# Altium footprint library PCB SMD.PcbLib: 79 footprints (part 1 of 5)
Each footprint in its own frame and in the unit in brackets; x right, y up, seen from the top. Pads: shape width x height; smd on the part's side, far side on the other; paste and mask are expansions set on the pad; w line width, h text height; cw(c..) or ccw(c..) is an arc to the next point about the centre after c.
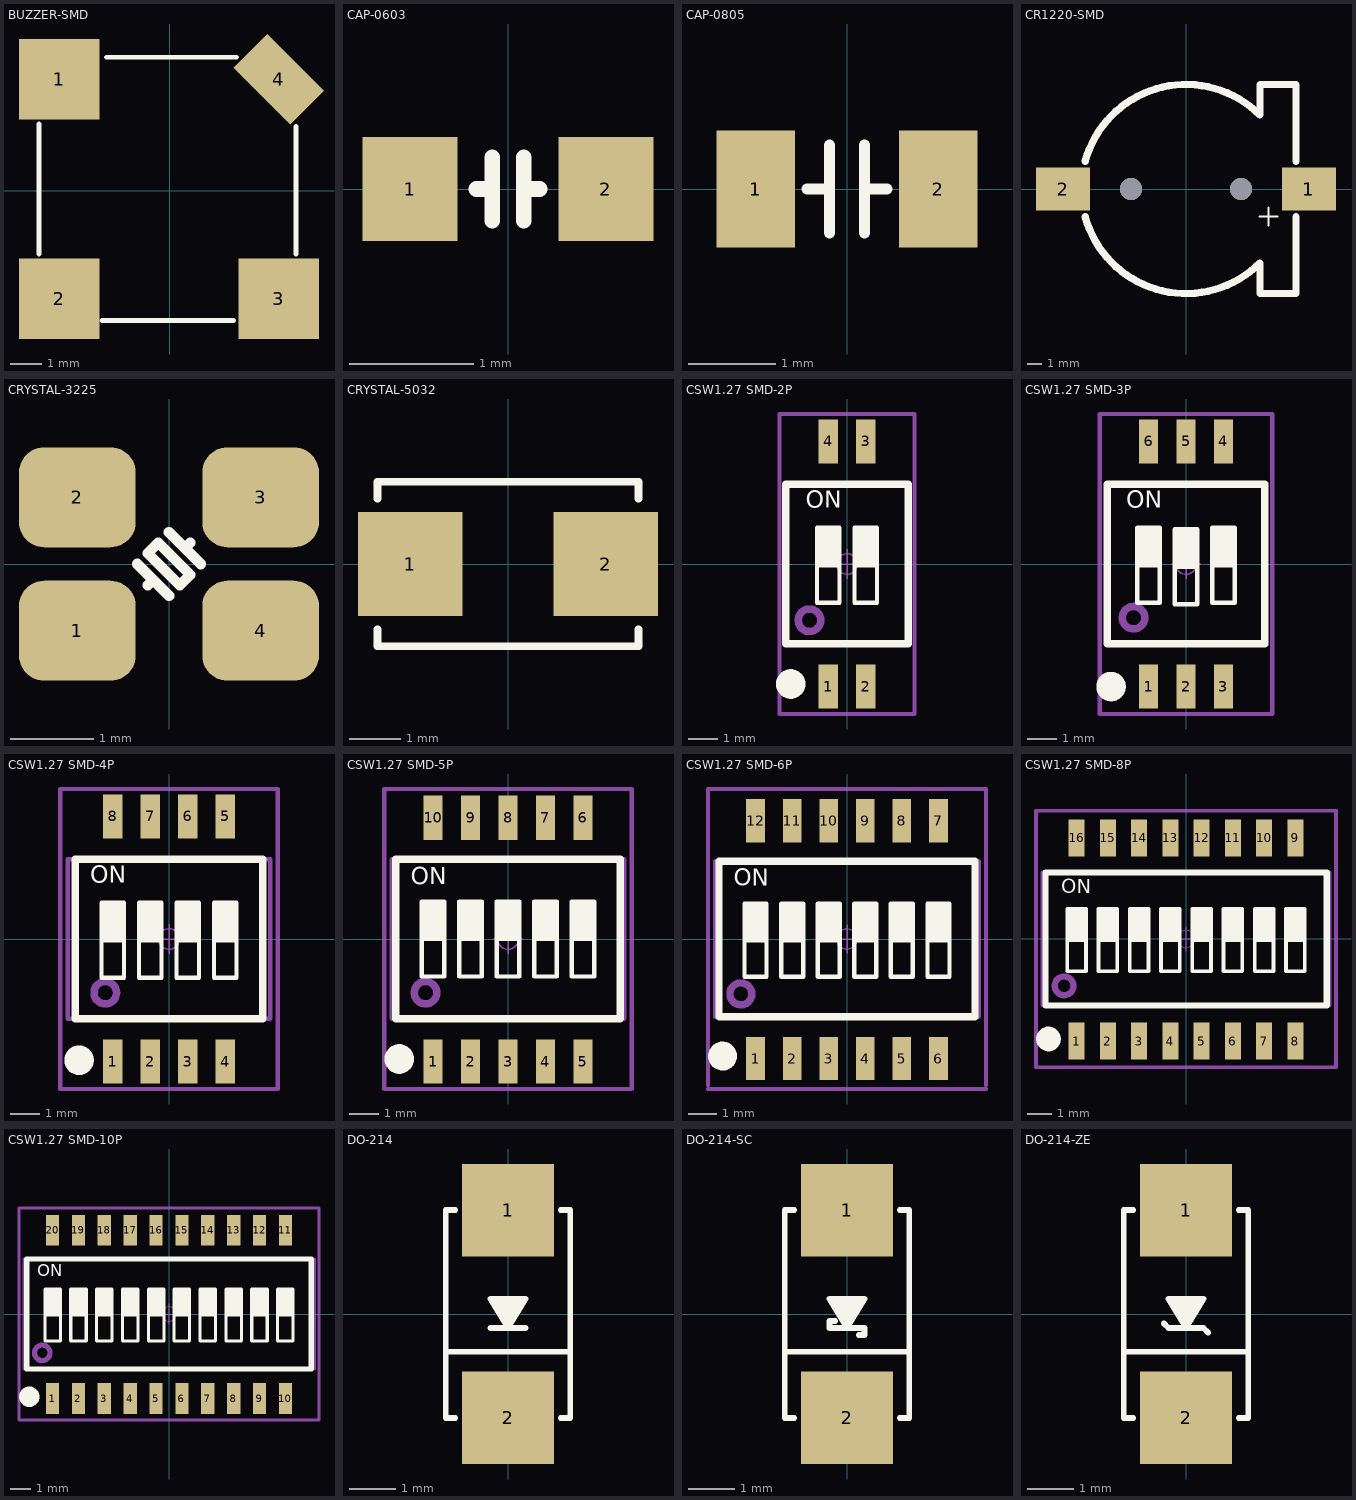
[diagram p0: the footprints below, top view; thin cyan lines are the x and y axes]

## BUZZER-SMD [mil]
pads (4):
  rect 100x100 smd: 1(-137.81,138.81) 2(-137.81,-134.81) 3(135.81,-134.81)
  rect 60x100 smd rot 45: 4(135.81,138.81)
Top Overlay:
  lines w6: -162.81,-78.81 -162.81,83.19 ; -84.81,-161.81 79.19,-161.81 ; -78.81,166.19 83.19,166.19 ; 157,-79 157,80
3D body "User Library-HCS09G.STEP": height 141.73, standoff 0, extent -172.32,-167.32 162.33,167.33

## CAP-0603 [mil]
pads (2):
  rect 30x33 smd: 1(-31,0) 2(31,0)
Top Overlay:
  lines w5: -10,0 -5,0 ; -5,-10 -5,10 ; 5,-10 5,10 ; 5,0 10,0
3D body "SW3dPS-0603 SMD Capacitor.STEP": height 12.39, standoff 0.5, extent -31.5,-15.75 31.5,15.75

## CAP-0805 [mm]
pads (2):
  rect 0.9x1.35 smd: 1(-1.05,0) 2(1.05,0)
Top Overlay:
  lines w0.127: -0.457,0 -0.203,0 ; -0.203,-0.508 -0.203,0.508 ; 0.203,-0.508 0.203,0.508 ; 0.203,0 0.457,0
3D body "User Library-CAPC2012X___.STEP": height 0.57, standoff 0, extent -1,-0.635 1,0.635

## CR1220-SMD [mm]
pads (2):
  rect 3.75x3 smd: 1(8.509,0) 2(-8.509,0)
via -3.81,0 diameter 1.5 hole 1.5
via 3.81,0 diameter 1.5 hole 1.5
Top Overlay:
  lines w0.127: 5.08,-1.905 6.35,-1.905 ; 5.715,-2.54 5.715,-1.27
  lines w0.508: -6.984,-1.905 ccw(c0,0) 5.119,-5.119 5.119,-7.239 7.62,-7.239 7.62,-1.905 ; -6.984,1.905 cw(c0,0) 5.119,5.119 5.119,7.239 7.62,7.239 7.62,1.905
3D body "User Library-Battery Holder for CR1220 SMD.STEP": height 4.26, standoff -0.49, extent -9.273,-7.366 9.527,7.383

## CRYSTAL-3225 [mm]
pads (4):
  rrect50% 1.4x1.2 smd: 1(-1.1,-0.8) 2(-1.1,0.8) 3(1.1,0.8) 4(1.1,-0.8)
Top Overlay:
  lines w0.127: -0.381,0 0,-0.381 ; -0.254,-0.254 -0.191,-0.191 ; 0,0.381 0.381,0 ; 0.191,0.191 0.254,0.254 ; -0.254,0.127 0.127,-0.254 0.254,-0.127 -0.127,0.254 -0.254,0.127
3D body "User Library-CTS.step": height 0.77, standoff 0, extent -1.6,-1.25 1.6,1.25

## CRYSTAL-5032 [mil]
pads (2):
  rect 80x80 smd: 1(-75,0) 2(75,0)
Top Overlay:
  lines w5.91: -100,-50 -100,-62.99 -98.43,-62.99 98.43,-62.99 100,-62.99 100,-50 ; -100,50 -100,62.99 -98.43,62.99 98.43,62.99 100,62.99 100,50
3D body "User Library-ABM3-1.STEP": height 51.18, standoff 0, extent -98.42,-62.99 98.43,63

## CSW1.27 SMD-2P [mm]
pads (4):
  rect 0.65x1.5 smd: 1(-0.635,-4.15) 2(0.635,-4.15) 3(0.635,4.15) 4(-0.635,4.15)
Top Overlay:
  circle w0.5: c-1.905,-4.064 r0.25
  region: 1.016,1.225 0.254,1.225 0.254,-0.045 1.016,-0.045
  region: -0.254,1.225 -1.016,1.225 -1.016,-0.045 -0.254,-0.045
  lines w0.15: -1.016,-0.045 -0.254,-0.045 ; 0.254,-0.045 1.016,-0.045 ; -1.016,-1.315 -1.016,1.225 -0.254,1.225 -0.254,-1.315 -1.016,-1.315 ; 0.254,-1.315 0.254,1.225 1.016,1.225 1.016,-1.315 0.254,-1.315
  lines w0.254: -2.07,-2.7 2.07,-2.7 2.07,2.7 -2.07,2.7 -2.07,-2.7
  text "ON" at -1.397,1.696 h1
Mechanical 13:
  circle w0.254: c-1.27,-1.905 r0.381
  lines w0.15: -2.032,-2.7 -2.032,2.7 2.032,2.7 2.032,-2.7 -2.032,-2.7
Mechanical 15:
  circle w0.05: c0,0 r0.35
  lines w0.05: -0.5,0 0.5,0 ; 0,-0.5 0,0.5
  lines w0.15: -2.286,-5.08 -2.286,5.08 2.286,5.08 2.286,-5.08 2.159,-5.08 -2.286,-5.08
3D body "CSW1.27-SMD-2P.STEP": height 2.35, standoff 0, extent -2.07,-4.35 2.07,4.35

## CSW1.27 SMD-3P [mm]
pads (6):
  rect 0.65x1.5 smd: 1(-1.27,-4.15) 2(0,-4.15) 3(1.27,-4.15) 4(1.27,4.15) 5(0,4.15) 6(-1.27,4.15)
Top Overlay:
  circle w0.5: c-2.54,-4.15 r0.25
  region: -0.889,1.225 -1.651,1.225 -1.651,-0.045 -0.889,-0.045
  region: 0.381,1.184 -0.381,1.184 -0.381,-0.086 0.381,-0.086
  region: 1.651,1.225 0.889,1.225 0.889,-0.045 1.651,-0.045
  lines w0.15: -1.651,-0.045 -0.889,-0.045 ; -0.381,-0.086 0.381,-0.086 ; 0.889,-0.045 1.651,-0.045 ; -1.651,-1.315 -0.889,-1.315 -0.889,1.225 -1.651,1.225 -1.651,-1.315 ; -0.381,-1.356 0.381,-1.356 0.381,1.184 -0.381,1.184 -0.381,-1.356 ; 0.889,-1.315 1.651,-1.315 1.651,1.225 0.889,1.225 0.889,-1.315
  lines w0.254: -2.667,-2.7 -2.667,2.7 2.667,2.7 2.667,-2.7 -2.667,-2.7
  text "ON" at -2.032,1.696 h1
Mechanical 13:
  circle w0.254: c-1.778,-1.819 r0.381
  lines w0.15: -2.667,-2.7 2.705,-2.7 2.705,2.7 -2.667,2.7 -2.667,-2.7
Mechanical 15:
  circle w0.05: c0,0 r0.35
  lines w0.05: -0.5,0 0.5,0 ; 0,-0.5 0,0.5
  lines w0.15: -2.921,-5.08 2.159,-5.08 2.921,-5.08 2.921,5.08 -2.921,5.08 -2.921,-5.08
3D body "CSW1.27-SMD-3P.STEP": height 2.35, standoff 0, extent -2.705,-4.35 2.705,4.35

## CSW1.27 SMD-4P [mm]
pads (8):
  rect 0.65x1.5 smd: 1(-1.905,-4.15) 2(-0.635,-4.15) 3(0.635,-4.15) 4(1.905,-4.15) 5(1.905,4.15) 6(0.635,4.15) 7(-0.635,4.15) 8(-1.905,4.15)
Top Overlay:
  circle w0.5: c-3.048,-4.105 r0.25
  region: -1.524,1.225 -2.286,1.225 -2.286,-0.045 -1.524,-0.045
  region: -0.254,1.225 -1.016,1.225 -1.016,-0.045 -0.254,-0.045
  region: 1.016,1.225 0.254,1.225 0.254,-0.045 1.016,-0.045
  region: 2.286,1.225 1.524,1.225 1.524,-0.045 2.286,-0.045
  lines w0.15: -2.286,-0.045 -1.524,-0.045 ; -1.016,-0.045 -0.254,-0.045 ; 0.254,-0.045 1.016,-0.045 ; 1.524,-0.045 2.286,-0.045 ; -2.286,-1.315 -1.524,-1.315 -1.524,1.225 -2.286,1.225 -2.286,-1.315 ; -1.016,-1.315 -0.254,-1.315 -0.254,1.225 -1.016,1.225 -1.016,-1.315 ; 0.254,-1.315 1.016,-1.315 1.016,1.225 0.254,1.225 0.254,-1.315 ; 1.524,-1.315 2.286,-1.315 2.286,1.225 1.524,1.225 1.524,-1.315
  lines w0.254: -3.175,-2.7 -3.175,2.7 3.175,2.7 3.175,-2.7 -3.175,-2.7
  text "ON" at -2.667,1.696 h1
Mechanical 13:
  circle w0.254: c-2.159,-1.819 r0.381
  lines w0.15: -3.429,-2.7 3.429,-2.7 3.429,2.7 -3.429,2.7 -3.429,-2.7
Mechanical 15:
  circle w0.05: c0,0 r0.35
  lines w0.05: -0.5,0 0.5,0 ; 0,-0.5 0,0.5
  lines w0.15: -3.683,-5.08 2.159,-5.08 3.683,-5.08 3.683,5.08 -3.683,5.08 -3.683,-5.08
3D body "CSW1.27-SMD-4P.STEP": height 2.35, standoff 0, extent -3.34,-4.35 3.34,4.35

## CSW1.27 SMD-5P [mm]
pads (10):
  rect 0.65x1.5 smd: 1(-2.54,-4.15) 2(-1.27,-4.15) 3(0,-4.15) 4(1.27,-4.15) 5(2.54,-4.15) 6(2.54,4.105) 7(1.27,4.105) 8(0,4.105) 9(-1.27,4.105) 10(-2.54,4.105)
Top Overlay:
  circle w0.5: c-3.683,-4.064 r0.25
  region: 0.381,1.27 -0.381,1.27 -0.381,0 0.381,0
  region: 2.921,1.27 2.159,1.27 2.159,0 2.921,0
  region: 1.651,1.27 0.889,1.27 0.889,0 1.651,0
  region: -0.889,1.27 -1.651,1.27 -1.651,0 -0.889,0
  region: -2.159,1.27 -2.921,1.27 -2.921,0 -2.159,0
  lines w0.15: -2.921,0 -2.159,0 ; -1.651,0 -0.889,0 ; -0.381,0 0.381,0 ; 0.889,0 1.651,0 ; 2.159,0 2.921,0 ; -2.921,-1.27 -2.921,1.27 -2.159,1.27 -2.159,-1.27 -2.921,-1.27 ; -1.651,-1.27 -1.651,1.27 -0.889,1.27 -0.889,-1.27 -1.651,-1.27 ; -0.381,-1.27 0.381,-1.27 0.381,1.27 -0.381,1.27 -0.381,-1.27 ; 0.889,-1.27 0.889,1.27 1.651,1.27 1.651,-1.27 0.889,-1.27 ; 2.159,-1.27 2.159,1.27 2.921,1.27 2.921,-1.27 2.159,-1.27
  lines w0.254: -3.81,-2.7 3.81,-2.7 3.81,2.7 -3.81,2.7 -3.81,-2.7
  text "ON" at -3.302,1.651 h1
Mechanical 13:
  circle w0.254: c-2.794,-1.819 r0.381
  lines w0.15: -3.937,-2.7 -3.937,2.7 3.937,2.7 3.937,-2.7 -3.937,-2.7
Mechanical 15:
  circle w0.05: c0,0 r0.35
  lines w0.05: -0.5,0 0.5,0 ; 0,-0.5 0,0.5
  lines w0.15: -4.191,-5.08 -4.191,5.08 4.191,5.08 4.191,-5.08 2.159,-5.08 -4.191,-5.08
3D body "CSW1.27-SMD-5P.STEP": height 2.35, standoff 0, extent -3.975,-4.35 3.975,4.35

## CSW1.27 SMD-6P [mm]
pads (12):
  rect 0.65x1.5 smd: 1(-3.175,-4.15) 2(-1.905,-4.15) 3(-0.635,-4.15) 4(0.635,-4.15) 5(1.905,-4.15) 6(3.175,-4.15) 7(3.175,4.105) 8(1.905,4.105) 9(0.635,4.105) 10(-0.635,4.105) 11(-1.905,4.105) 12(-3.175,4.105)
Top Overlay:
  circle w0.5: c-4.318,-4.064 r0.25
  region: 3.556,1.225 2.794,1.225 2.794,-0.045 3.556,-0.045
  region: 2.286,1.225 1.524,1.225 1.524,-0.045 2.286,-0.045
  region: 1.016,1.225 0.254,1.225 0.254,-0.045 1.016,-0.045
  region: -0.254,1.225 -1.016,1.225 -1.016,-0.045 -0.254,-0.045
  region: -1.524,1.225 -2.286,1.225 -2.286,-0.045 -1.524,-0.045
  region: -2.794,1.225 -3.556,1.225 -3.556,-0.045 -2.794,-0.045
  lines w0.15: -3.556,-0.045 -2.794,-0.045 ; -2.286,-0.045 -1.524,-0.045 ; -1.016,-0.045 -0.254,-0.045 ; 0.254,-0.045 1.016,-0.045 ; 1.524,-0.045 2.286,-0.045 ; 2.794,-0.045 3.556,-0.045 ; -3.556,-1.315 -3.556,1.225 -2.794,1.225 -2.794,-1.315 -3.556,-1.315 ; -2.286,-1.315 -2.286,1.225 -1.524,1.225 -1.524,-1.315 -2.286,-1.315 ; -1.016,-1.315 -1.016,1.225 -0.254,1.225 -0.254,-1.315 -1.016,-1.315 ; 0.254,-1.315 0.254,1.225 1.016,1.225 1.016,-1.315 0.254,-1.315 ; 1.524,-1.315 1.524,1.225 2.286,1.225 2.286,-1.315 1.524,-1.315 ; 2.794,-1.315 2.794,1.225 3.556,1.225 3.556,-1.315 2.794,-1.315
  lines w0.254: -4.445,-2.7 4.445,-2.7 4.445,2.7 -4.445,2.7 -4.445,-2.7
  text "ON" at -3.937,1.651 h1
Mechanical 13:
  circle w0.254: c-3.683,-1.905 r0.381
  lines w0.15: -4.572,-2.7 -4.572,2.7 4.572,2.7 4.572,-2.7 -4.572,-2.7
Mechanical 15:
  circle w0.05: c0,0 r0.35
  lines w0.05: -0.5,0 0.5,0 ; 0,-0.5 0,0.5
  lines w0.15: -4.826,-5.207 2.159,-5.207 4.826,-5.207 ; -4.826,-5.08 -4.826,5.207 4.826,5.207 4.826,-5.08
3D body "CSW1.27-SMD-6P.STEP": height 2.35, standoff 0, extent -4.61,-4.35 4.61,4.35

## CSW1.27 SMD-8P [mm]
pads (16):
  rect 0.65x1.5 smd: 1(-4.445,-4.15) 2(-3.175,-4.15) 3(-1.905,-4.15) 4(-0.635,-4.15) 5(0.635,-4.15) 6(1.905,-4.15) 7(3.175,-4.15) 8(4.445,-4.15) 9(4.445,4.105) 10(3.175,4.105) 11(1.905,4.105) 12(0.635,4.105) 13(-0.635,4.105) 14(-1.905,4.105) 15(-3.175,4.105) 16(-4.445,4.105)
Top Overlay:
  circle w0.5: c-5.588,-4.064 r0.25
  region: -4.064,1.225 -4.826,1.225 -4.826,-0.045 -4.064,-0.045
  region: -2.794,1.225 -3.556,1.225 -3.556,-0.045 -2.794,-0.045
  region: -1.524,1.225 -2.286,1.225 -2.286,-0.045 -1.524,-0.045
  region: -0.254,1.225 -1.016,1.225 -1.016,-0.045 -0.254,-0.045
  region: 1.016,1.225 0.254,1.225 0.254,-0.045 1.016,-0.045
  region: 2.286,1.225 1.524,1.225 1.524,-0.045 2.286,-0.045
  region: 3.556,1.225 2.794,1.225 2.794,-0.045 3.556,-0.045
  region: 4.826,1.225 4.064,1.225 4.064,-0.045 4.826,-0.045
  lines w0.15: -4.826,-0.045 -4.064,-0.045 ; -3.556,-0.045 -2.794,-0.045 ; -2.286,-0.045 -1.524,-0.045 ; -1.016,-0.045 -0.254,-0.045 ; 0.254,-0.045 1.016,-0.045 ; 1.524,-0.045 2.286,-0.045 ; 2.794,-0.045 3.556,-0.045 ; 4.064,-0.045 4.826,-0.045 ; -4.826,-1.315 -4.064,-1.315 -4.064,1.225 -4.826,1.225 -4.826,-1.315 ; -3.556,-1.315 -2.794,-1.315 -2.794,1.225 -3.556,1.225 -3.556,-1.315 ; -2.286,-1.315 -1.524,-1.315 -1.524,1.225 -2.286,1.225 -2.286,-1.315 ; -1.016,-1.315 -0.254,-1.315 -0.254,1.225 -1.016,1.225 -1.016,-1.315 ; 0.254,-1.315 1.016,-1.315 1.016,1.225 0.254,1.225 0.254,-1.315 ; 1.524,-1.315 2.286,-1.315 2.286,1.225 1.524,1.225 1.524,-1.315 ; 2.794,-1.315 3.556,-1.315 3.556,1.225 2.794,1.225 2.794,-1.315 ; 4.064,-1.315 4.826,-1.315 4.826,1.225 4.064,1.225 4.064,-1.315
  lines w0.254: -5.715,-2.7 -5.715,2.7 5.715,2.7 5.715,-2.7 -5.715,-2.7
  text "ON" at -5.08,1.651 h1
Mechanical 13:
  circle w0.254: c-4.953,-1.905 r0.381
  lines w0.15: -5.842,-2.7 5.842,-2.7 5.842,2.7 -5.842,2.7 -5.842,-2.7
Mechanical 15:
  circle w0.05: c0,0 r0.35
  lines w0.05: -0.5,0 0.5,0 ; 0,-0.5 0,0.5
  lines w0.15: 6.095,-5.21 -6.096,-5.21 -6.096,-5.207 -6.096,5.207 6.096,5.207 6.096,-5.21
3D body "CSW1.27-SMD-8P.STEP": height 2.35, standoff 0, extent -5.88,-4.35 5.88,4.35

## CSW1.27 SMD-10P [mm]
pads (20):
  rect 0.65x1.5 smd: 1(-5.715,-4.15) 2(-4.445,-4.15) 3(-3.175,-4.15) 4(-1.905,-4.15) 5(-0.635,-4.15) 6(0.635,-4.15) 7(1.905,-4.15) 8(3.175,-4.15) 9(4.445,-4.15) 10(5.715,-4.15) 11(5.715,4.105) 12(4.445,4.105) 13(3.175,4.105) 14(1.905,4.105) 15(0.635,4.105) 16(-0.635,4.105) 17(-1.905,4.105) 18(-3.175,4.105) 19(-4.445,4.105) 20(-5.715,4.105)
Top Overlay:
  circle w0.5: c-6.858,-4.064 r0.25
  region: -5.334,1.225 -6.096,1.225 -6.096,-0.045 -5.334,-0.045
  region: -4.064,1.225 -4.826,1.225 -4.826,-0.045 -4.064,-0.045
  region: -2.794,1.225 -3.556,1.225 -3.556,-0.045 -2.794,-0.045
  region: -1.524,1.225 -2.286,1.225 -2.286,-0.045 -1.524,-0.045
  region: -0.254,1.225 -1.016,1.225 -1.016,-0.045 -0.254,-0.045
  region: 1.016,1.225 0.254,1.225 0.254,-0.045 1.016,-0.045
  region: 2.286,1.225 1.524,1.225 1.524,-0.045 2.286,-0.045
  region: 3.556,1.225 2.794,1.225 2.794,-0.045 3.556,-0.045
  region: 4.826,1.225 4.064,1.225 4.064,-0.045 4.826,-0.045
  region: 6.096,1.225 5.334,1.225 5.334,-0.045 6.096,-0.045
  lines w0.15: -6.096,-0.045 -5.334,-0.045 ; -4.826,-0.045 -4.064,-0.045 ; -3.556,-0.045 -2.794,-0.045 ; -2.286,-0.045 -1.524,-0.045 ; -1.016,-0.045 -0.254,-0.045 ; 0.254,-0.045 1.016,-0.045 ; 1.524,-0.045 2.286,-0.045 ; 2.794,-0.045 3.556,-0.045 ; 4.064,-0.045 4.826,-0.045 ; 5.334,-0.045 6.096,-0.045 ; -6.096,-1.315 -5.334,-1.315 -5.334,1.225 -6.096,1.225 -6.096,-1.315 ; -4.826,-1.315 -4.064,-1.315 -4.064,1.225 -4.826,1.225 -4.826,-1.315 ; -3.556,-1.315 -2.794,-1.315 -2.794,1.225 -3.556,1.225 -3.556,-1.315 ; -2.286,-1.315 -1.524,-1.315 -1.524,1.225 -2.286,1.225 -2.286,-1.315 ; -1.016,-1.315 -0.254,-1.315 -0.254,1.225 -1.016,1.225 -1.016,-1.315 ; 0.254,-1.315 1.016,-1.315 1.016,1.225 0.254,1.225 0.254,-1.315 ; 1.524,-1.315 2.286,-1.315 2.286,1.225 1.524,1.225 1.524,-1.315 ; 2.794,-1.315 3.556,-1.315 3.556,1.225 2.794,1.225 2.794,-1.315 ; 4.064,-1.315 4.826,-1.315 4.826,1.225 4.064,1.225 4.064,-1.315 ; 5.334,-1.315 6.096,-1.315 6.096,1.225 5.334,1.225 5.334,-1.315
  lines w0.254: -6.985,-2.7 6.985,-2.7 6.985,2.7 -6.985,2.7 -6.985,-2.7
  text "ON" at -6.477,1.651 h1
Mechanical 13:
  circle w0.254: c-6.223,-1.905 r0.381
  lines w0.15: -7.112,-2.7 -7.112,2.7 7.15,2.7 7.15,-2.7 -7.112,-2.7
Mechanical 15:
  circle w0.05: c0,0 r0.35
  lines w0.05: -0.5,0 0.5,0 ; 0,-0.5 0,0.5
  lines w0.15: -7.366,-5.207 -7.366,5.207 7.366,5.207 7.366,-5.207 -7.366,-5.207
3D body "CSW1.27-SMD-10P.STEP": height 2.35, standoff 0, extent -7.15,-4.35 7.15,4.35

## DO-214 [mm]
pads (2):
  rect 2x2 smd: 1(0,2.25) 2(0,-2.25)
Top Overlay:
  region: 0,-0.305 -0.381,0.33 0.381,0.33
  lines w0.102: -0.381,-0.305 -0.381,-0.305
  lines w0.127: -1.35,-0.818 1.35,-0.818 ; -1.143,-2.25 -1.35,-2.25 -1.35,2.25 -1.143,2.25 ; -0.381,-0.305 0.381,-0.305 ; 1.143,-2.25 1.35,-2.25 1.35,2.25 1.143,2.25 ; -0.381,0.33 0.381,0.33 0,-0.305 -0.381,0.33
3D body "User Library-DO-214AC(SMA).STEP": height 2.3, standoff 0.01, extent -1.397,-2.743 1.397,2.743

## DO-214-SC [mm]
pads (2):
  rect 2x2 smd: 1(0,2.25) 2(0,-2.25)
Top Overlay:
  region: 0,-0.305 -0.381,0.33 0.381,0.33
  lines w0.127: -1.35,-0.818 1.35,-0.818 ; -1.143,-2.25 -1.35,-2.25 -1.35,2.25 -1.143,2.25 ; -0.253,-0.151 -0.381,-0.151 -0.381,-0.305 ; 0.253,-0.458 0.381,-0.458 0.381,-0.305 -0.381,-0.305 ; 1.143,-2.25 1.35,-2.25 1.35,2.25 1.143,2.25 ; -0.381,-0.305 -0.381,-0.305 ; -0.381,0.33 0,-0.305 0.381,0.33 -0.381,0.33
3D body "User Library-DO-214AC(SMA).STEP": height 2.3, standoff 0.01, extent -1.397,-2.743 1.397,2.743

## DO-214-ZE [mm]
pads (2):
  rect 2x2 smd: 1(0,2.25) 2(0,-2.25)
Top Overlay:
  region: -0.381,0.33 0.381,0.33 0,-0.305
  lines w0.127: -1.35,-0.818 1.35,-0.818 ; -1.143,-2.25 -1.35,-2.25 -1.35,2.25 -1.143,2.25 ; -0.483,-0.203 -0.381,-0.305 0.381,-0.305 0.483,-0.407 ; 1.143,-2.25 1.35,-2.25 1.35,2.25 1.143,2.25 ; -0.381,0.33 0,-0.305 0.381,0.33 -0.381,0.33
3D body "User Library-DO-214AC(SMA).STEP": height 2.3, standoff 0.01, extent -1.397,-2.743 1.397,2.743